# Altium footprint library common.PcbLib: 552 footprints (part 22 of 35)
Each footprint in its own frame and in the unit in brackets; x right, y up, seen from the top. Pads: shape width x height; smd on the part's side, far side on the other; paste and mask are expansions set on the pad; w line width, h text height; cw(c..) or ccw(c..) is an arc to the next point about the centre after c.
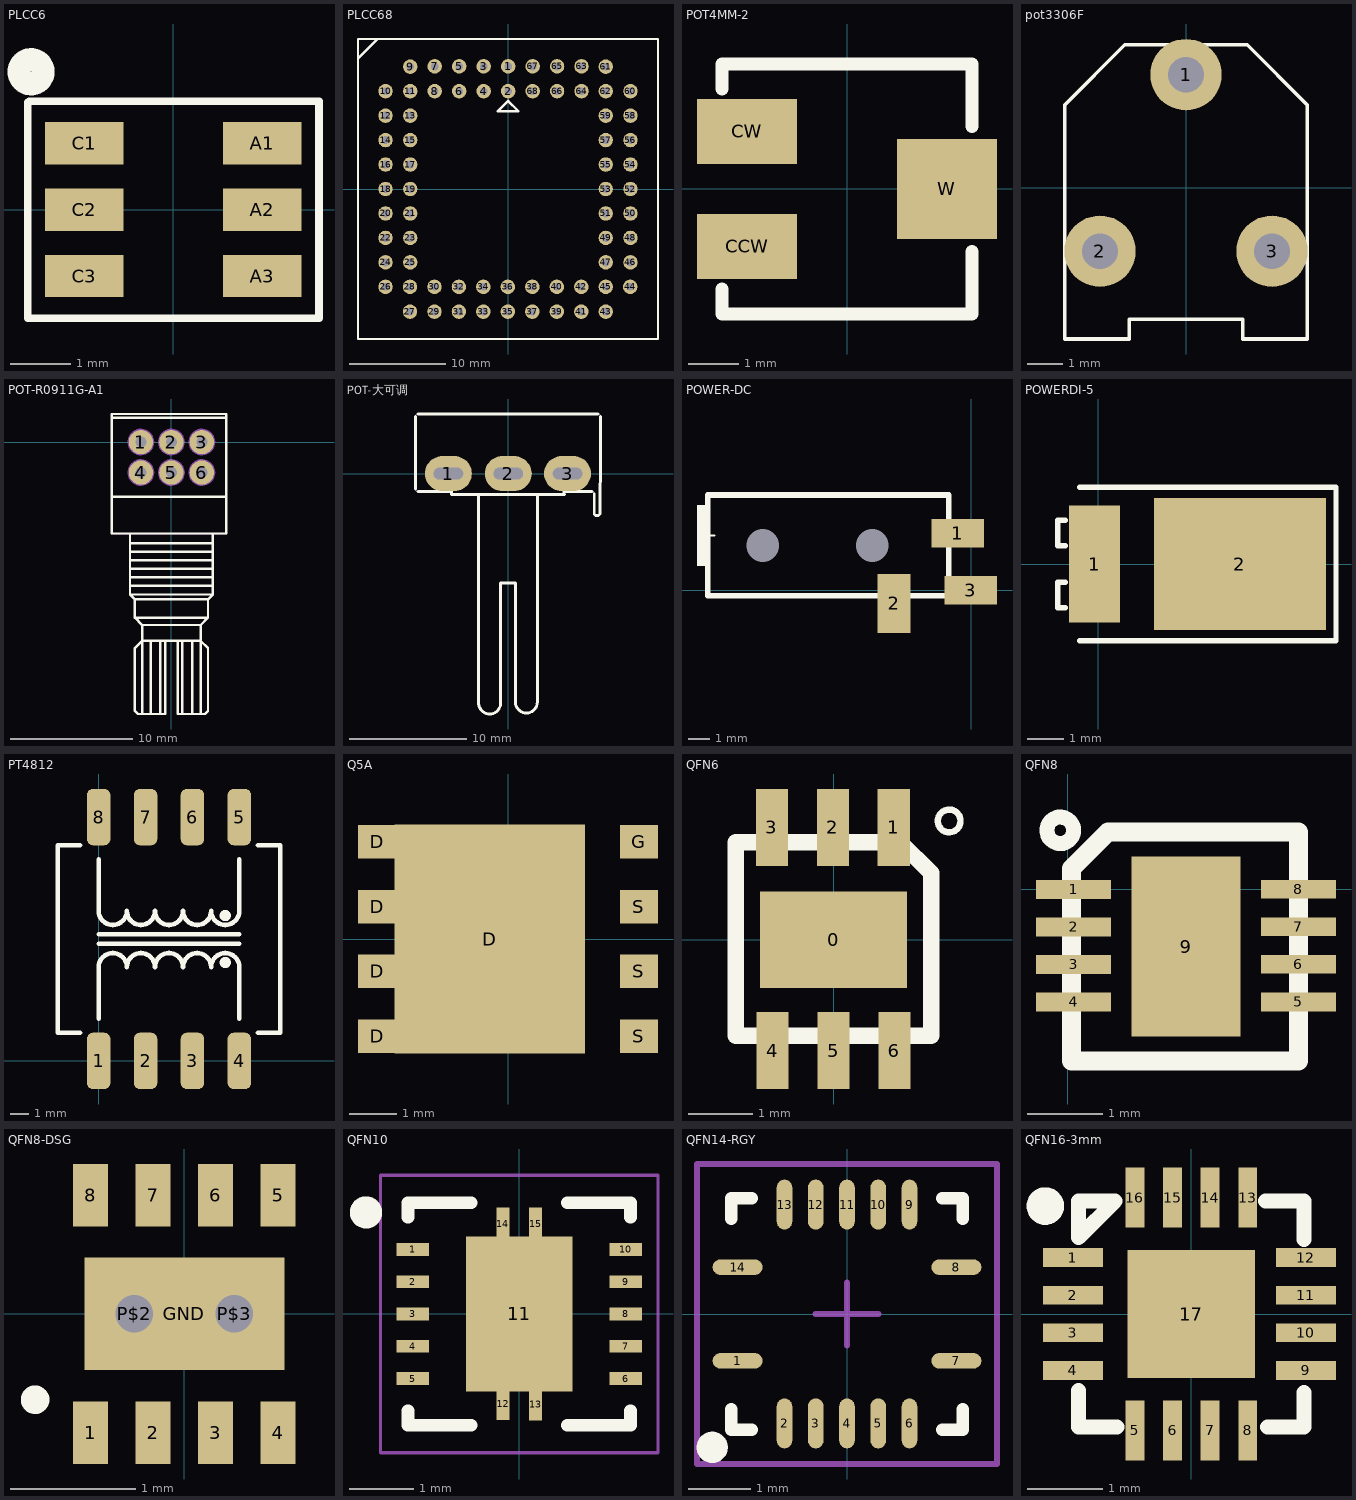
[diagram p21: the footprints below, top view; thin cyan lines are the x and y axes]

## PLCC6 [mm]
pads (6):
  rect 1.3x0.7 smd: A1(1.475,1.1) A2(1.475,0) A3(1.475,-1.1) C1(-1.475,1.1) C2(-1.475,0) C3(-1.475,-1.1)
Top Overlay:
  circle w0.381: c-2.359,2.286 r0.2
  lines w0.127: -2.413,-1.8 2.413,-1.8 2.413,1.8 -2.391,1.8 -2.413,1.778 -2.413,-1.8
3D body: height 2.01, standoff 0, extent -1.8,-1.85 1.8,1.65

## PLCC68 [mm]
pads (68):
  round 1.5 hole 0.8: 1(0.013,12.725) 2(0.013,10.16) 3(-2.527,12.725) 4(-2.527,10.16) 5(-5.067,12.725) 6(-5.067,10.16) 7(-7.607,12.725) 8(-7.607,10.16) 9(-10.147,12.7) 10(-12.713,10.16) 11(-10.147,10.16) 12(-12.713,7.62) 13(-10.147,7.62) 14(-12.713,5.08) 15(-10.147,5.08) 16(-12.713,2.54) 17(-10.147,2.54) 18(-12.713,0) 19(-10.147,0) 20(-12.713,-2.54) 21(-10.147,-2.54) 22(-12.713,-5.08) 23(-10.147,-5.08) 24(-12.713,-7.62) 25(-10.147,-7.62) 26(-12.713,-10.16) 27(-10.173,-12.725) 28(-10.173,-10.16) 29(-7.633,-12.725) 30(-7.633,-10.16) 31(-5.093,-12.725) 32(-5.093,-10.16) 33(-2.553,-12.725) 34(-2.553,-10.16) 35(-0.013,-12.725) 36(-0.013,-10.16) 37(2.527,-12.725) 38(2.527,-10.16) 39(5.067,-12.725) 40(5.067,-10.16) 41(7.607,-12.725) 42(7.607,-10.16) 43(10.147,-12.725) 44(12.687,-10.16) 45(10.147,-10.16) 46(12.713,-7.62) 47(10.147,-7.62) 48(12.713,-5.08) 49(10.147,-5.08) 50(12.713,-2.54) 51(10.147,-2.54) 52(12.713,0) 53(10.147,0) 54(12.713,2.54) 55(10.147,2.54) 56(12.713,5.08) 57(10.147,5.08) 58(12.713,7.62) 59(10.147,7.62) 60(12.713,10.16) 61(10.147,12.7) 62(10.147,10.16) 63(7.633,12.725) 64(7.633,10.16) 65(5.093,12.725) 66(5.093,10.16) 67(2.553,12.725) 68(2.553,10.16)
Top Overlay:
  lines w0.254: -15.57,13.564 -13.564,15.57 ; -15.57,-15.57 15.57,-15.57 15.57,15.57 -15.57,15.57 -15.57,-15.57 ; -1.041,8.09 1.067,8.09 0.013,9.144 -1.041,8.09
3D body: height 7.7, standoff -3.6, extent -15.387,-15.545 15.413,15.255

## POT4MM-2 [mm] "Square Trimming Potentiometer"
pads (3):
  rect 2x1.3 smd: CCW(-2,-1.15) CW(-2,1.15)
  rect 2x2 smd: W(2,0)
Top Overlay:
  lines w0.254: -2.5,-2 -2.5,-2.5 2.5,-2.5 2.5,-1.25 ; -2.5,2 -2.5,2.5 2.5,2.5 2.5,1.25
3D body: height 5.5, standoff 0, extent -2.489,-2.438 2.511,2.562

## pot3306F [mm]
pads (3):
  round 2 hole 1: 1(0,3.175) 2(-2.413,-1.778) 3(2.413,-1.778)
Top Overlay:
  lines w0.1: -2.611,-4.241 -1.595,-4.241 ; -2.964,-1.533 -2.964,-2.07 -3.405,-2.07 -3.405,-1.533 -2.964,-1.533 ; -2.964,-1.533 -2.084,-1.533 -2.084,-2.076 ; -2.964,-1.533 -2.964,-2.076 -2.084,-2.076 ; -2.084,-2.076 -2.084,-1.535 -1.595,-1.535 -1.595,-2.076 -2.084,-2.076 ; -1.595,-4.241 -3.405,-4.241 -3.405,-3.681 -3.405,-3.049 -3.405,2.323 -1.719,4.01 1.719,4.01 3.405,2.323 3.405,-3.681 3.405,-4.241 1.595,-4.241 1.595,-3.681 -1.595,-3.681 -1.595,-4.241 ; -0.464,3.474 -0.464,2.938 -0.905,2.938 -0.905,3.474 -0.464,3.474 ; -0.464,3.474 0.416,3.474 0.416,2.94 ; -0.464,3.474 -0.464,2.94 0.416,2.94 ; 0.416,2.94 0.416,3.479 0.905,3.479 0.905,2.94 0.416,2.94 ; 2.036,-1.533 2.036,-2.07 1.595,-2.07 1.595,-1.533 2.036,-1.533 ; 2.036,-1.533 2.916,-1.533 2.916,-2.076 ; 2.036,-1.533 2.036,-2.076 2.916,-2.076 ; 2.916,-2.076 2.916,-1.535 3.405,-1.535 3.405,-2.076 2.916,-2.076
3D body: height 7.62, standoff -3.04, extent -3.302,-4.191 3.508,4.061

## POT-R0911G-A1 [mm]
height 11.3
pads (6):
  round 2 hole 0.9: 1(-2.5,0) 2(0,0) 3(2.5,0) 4(-2.5,-2.5) 5(0,-2.5) 6(2.5,-2.5)
Top Overlay:
  lines w0.2: -4.9,-4.5 4.5,-4.5 ; -4.9,2 4.5,2 ; -3.4,-11.8 3.4,-11.8 3.4,-12.5 ; -3.4,-11.1 3.4,-11.1 ; -3.4,-10.4 3.4,-10.4 ; -3.4,-9.7 3.4,-9.7 ; -3.4,-9 3.4,-9 ; -3.4,-8.3 3.4,-8.3 ; -3.4,-7.5 -3.4,-12.5 ; -2.4,-22.3 -2.4,-16.3 ; -1.7,-22.3 -1.7,-16.3 ; -0.9,-22.3 -0.9,-16.3 ; -0.5,-16.3 -0.5,-22.3 -2.75,-22.3 -3,-22.05 -3,-16.9 -2.4,-16.3 ; 0.5,-16.3 0.5,-22.3 2.75,-22.3 3,-22.05 3,-16.9 2.4,-16.3 ; 0.9,-22.3 0.9,-16.3 ; 1.7,-22.3 1.7,-16.3 ; 2.4,-22.3 2.4,-16.3 ; 3.4,-7.5 3.4,-12.5 ; -3.4,-12.5 0,-12.5 3.4,-12.5 ; -3.4,-12.5 -3,-12.9 ; -3,-14.4 0,-14.4 3,-14.4 ; -3,-14.4 -3,-12.9 ; -3,-14.4 -2.4,-15 ; -3,-12.9 0,-12.9 3,-12.9 ; -2.4,-16.3 0,-16.3 2.4,-16.3 ; -2.4,-16.3 -2.4,-15 ; -2.4,-15 0,-15 2.4,-15 ; 2.4,-16.3 2.4,-15 ; 2.4,-15 3,-14.4 ; 3,-14.4 3,-12.9 ; 3,-12.9 3.4,-12.5 ; -4.9,-7.5 -4.9,2.3 4.5,2.3 4.5,-7.5 -4.9,-7.5
Mechanical 7:
  circle w0.2: c2.5,-2.5 r1
  circle w0.2: c0,-2.5 r1
  circle w0.2: c-2.5,-2.5 r1
  circle w0.2: c2.5,0 r1
  circle w0.2: c0,0 r1
  circle w0.2: c-2.5,0 r1
  lines w0.1: -4.9,-4.5 4.5,-4.5 ; -4.9,2 4.5,2 ; -3.4,-11.8 3.4,-11.8 3.4,-12.5 ; -3.4,-11.1 3.4,-11.1 ; -3.4,-10.4 3.4,-10.4 ; -3.4,-9.7 3.4,-9.7 ; -3.4,-9 3.4,-9 ; -3.4,-8.3 3.4,-8.3 ; -3.4,-7.5 -3.4,-12.5 ; -2.4,-22.3 -2.4,-16.3 ; -1.7,-22.3 -1.7,-16.3 ; -0.9,-22.3 -0.9,-16.3 ; -0.5,-16.3 -0.5,-22.3 -2.75,-22.3 -3,-22.05 -3,-16.9 -2.4,-16.3 ; 0.5,-16.3 0.5,-22.3 2.75,-22.3 3,-22.05 3,-16.9 2.4,-16.3 ; 0.9,-22.3 0.9,-16.3 ; 1.7,-22.3 1.7,-16.3 ; 2.4,-22.3 2.4,-16.3 ; 3.4,-7.5 3.4,-12.5 ; -3.4,-12.5 -3,-12.9 ; -3.4,-12.5 0,-12.5 3.4,-12.5 ; -3,-14.4 -2.4,-15 ; -3,-14.4 -3,-12.9 ; -3,-14.4 0,-14.4 3,-14.4 ; -3,-12.9 0,-12.9 3,-12.9 ; -2.4,-16.3 -2.4,-15 ; -2.4,-16.3 0,-16.3 2.4,-16.3 ; -2.4,-15 0,-15 2.4,-15 ; 2.4,-16.3 2.4,-15 ; 2.4,-15 3,-14.4 ; 3,-14.4 3,-12.9 ; 3,-12.9 3.4,-12.5 ; -4.9,-7.5 4.5,-7.5 4.5,2.3 -4.9,2.3 -4.9,-7.5
3D body: height 12.64, standoff -2.5, extent -5.73,-27.97 5.768,1.504

## POT-大可调 [mm]
pads (3):
  oval 4x3 hole 1 slot 2.5 at 0 deg: 1(-5.104,0) 2(0,0) 3(5.05,0)
Top Overlay:
  lines w0.254: -7.899,-1.324 -7.899,0 -7.899,4.88 ; -7.699,-1.524 -7.524,-1.524 -6.342,-1.524 -4.979,-1.524 -4.829,-1.524 -4.829,-1.778 4.778,-1.778 ; -7.699,5.08 -6.883,5.08 6.757,5.08 7.649,5.08 ; -0.724,-0.25 0.673,-0.25 0.673,0.25 -0.724,0.25 -0.724,-0.228 ; 4.74,-1.778 4.74,-1.524 7.122,-1.524 ; 7.322,-3.429 7.322,-1.724 ; 7.449,-3.556 7.702,-3.556 ; 7.829,-3.429 7.829,-1.524 7.849,0 7.849,3.048 7.849,4.88 ; -5.804,-0.25 -4.407,-0.25 -4.407,0.25 -5.804,0.25 -5.804,-0.25 ; -2.521,-19.462 ccw(c-1.59,-19.544) -0.66,-19.462 -0.66,-9.302 0.61,-9.302 0.61,-19.462 ccw(c1.543,-19.462) 2.477,-19.462 2.477,-9.302 2.477,-1.778 -2.521,-1.778 -2.521,-9.302 -2.521,-19.462 ; 4.356,-0.25 5.753,-0.25 5.753,0.25 4.356,0.25 4.356,-0.25
Mechanical 6:
  lines w0.1: -7.899,-1.324 ccw(c-7.699,-1.324) -7.699,-1.524 ; -7.899,4.88 cw(c-7.699,4.88) -7.699,5.08 ; 7.122,-1.524 cw(c7.122,-1.724) 7.322,-1.724 ; 7.649,5.08 cw(c7.649,4.88) 7.849,4.88
3D body: height 20.62, standoff -4, extent -7.849,-20.433 7.899,5.135

## POWER-DC [mm]
pads (5):
  round 0 hole 1.5 mask+0: 0(-9.521,2.057) 0(-4.521,2.057)
  rect 2.4x1.3 smd: 1(-0.621,2.607) 3(-0.021,0.007)
  rect 1.5x2.7 smd: 2(-3.521,-0.593)
Top Overlay:
  rectangle: -12.521,1.107 -11.921,3.907
  lines w0.1: -12.221,2.507 -11.721,2.507
  lines w0.254: -12.021,-0.243 -12.021,4.357 -1.021,4.357 -1.021,-0.243 -12.021,-0.243
3D body: height 4.4, standoff -0.8, extent -11.996,-1.818 0.604,4.482

## POWERDI-5 [mm]
pads (2):
  rect 1.4x3.2 smd: 1(-0.1,0)
  rect 4.7x3.6 smd: 2(3.87,0)
Top Overlay:
  lines w0.15: -0.9,-1.2 -1.1,-1.2 -1.1,-0.5 -0.9,-0.5 ; -0.9,0.5 -1.1,0.5 -1.1,1.2 -0.9,1.2 ; -0.5,-2.1 6.5,-2.1 6.5,2.1 -0.5,2.1
3D body: height 1.17, standoff 0.02, extent -0.5,-2.025 6.1,2.025

## PT4812 [mm] "Transformer for Digital Audio Data Transmission"
height 9.15
pads (8):
  rrect50% 1.27x3.05 smd: 1(0,0) 2(2.54,0) 3(5.08,0) 4(7.62,0) 5(7.62,13.21) 6(5.08,13.21) 7(2.54,13.21) 8(0,13.21)
Top Overlay:
  circle w0.254: c6.858,7.874 r0.18
  circle w0.254: c6.858,5.334 r0.18
  lines w0.254: -1.016,1.524 -2.22,1.524 -2.22,11.686 -1.016,11.686 ; 0,2.286 0,5.08 cw(c0.762,5.08) 0.762,5.842 cw(c0.762,5.08) 1.524,5.08 cw(c2.286,5.08) 2.286,5.842 cw(c2.286,5.08) 3.048,5.08 cw(c3.81,5.08) 3.81,5.842 cw(c3.81,5.08) 4.572,5.08 cw(c5.334,5.08) 5.334,5.842 cw(c5.334,5.08) 6.096,5.08 cw(c6.858,5.08) 6.858,5.842 cw(c6.858,5.08) 7.62,5.08 7.62,2.286 ; 0,6.35 7.62,6.35 ; 0,6.858 7.62,6.858 0.508,6.858 ; 0,10.922 0,8.128 ccw(c0.762,8.128) 0.762,7.366 ccw(c0.762,8.128) 1.524,8.128 ccw(c2.286,8.128) 2.286,7.366 ccw(c2.286,8.128) 3.048,8.128 ccw(c3.81,8.128) 3.81,7.366 ccw(c3.81,8.128) 4.572,8.128 ccw(c5.334,8.128) 5.334,7.366 ccw(c5.334,8.128) 6.096,8.128 ccw(c6.858,8.128) 6.858,7.366 ccw(c6.858,8.128) 7.62,8.128 7.62,10.922 ; 6.731,5.334 7.038,5.334 ; 6.731,7.874 7.038,7.874 ; 8.636,1.524 9.84,1.524 9.84,11.686 8.636,11.686
3D body: height 8.86, standoff 0.02, extent -2.281,-0.289 9.779,13.243

## Q5A [mm] "TI PACKAGE"
pads (9):
  rect 0.8x0.7 smd: D(-2.75,-2.04) D(-2.75,-0.68) D(-2.75,0.68) D(-2.75,2.04) G(2.75,2.04) S(2.75,-2.04) S(2.75,-0.68) S(2.75,0.68)
  rect 4x4.8 smd: D(-0.381,0)
3D body: height 1, standoff 0, extent -3.003,-2.438 2.997,2.462

## QFN6 [mm] "SOT-23/SC-74A; 5 Leads; Body 3.1 x 3 mm, inc. leads (LxW max)"
height 1.45
pads (7):
  rect 2.3x1.5 smd: 0(0,0)
  rect 0.5x1.2 smd: 1(0.94,1.753) 2(-0.01,1.753) 3(-0.96,1.753) 4(-0.95,-1.727) 5(0,-1.727) 6(0.95,-1.727)
Top Overlay:
  circle w0.1: c1.804,1.854 r0.177
  lines w0.254: -1.524,-1.499 1.524,-1.499 1.524,1.041 1.041,1.524 -1.524,1.524 -1.524,-1.499
3D body: height 1, standoff 0, extent -1.524,-1.499 1.524,1.524

## QFN8 [mm] "SOT-23/SC-74A; 5 Leads; Body 3.1 x 3 mm, inc. leads (LxW max)"
height 1.45
pads (9):
  rect 1x0.25 smd: 1(0.076,0) 2(0.076,-0.5) 3(0.076,-1) 5(3.073,-1.499) 6(3.073,-0.999) 7(3.073,-0.499) 8(3.073,0.001)
  rect 1x0.25 smd paste+0: 4(0.076,-1.5)
  rect 1.45x2.4 smd: 9(1.575,-0.762)
Top Overlay:
  circle w0.2: c-0.101,0.787 r0.177
  lines w0.254: 0.051,-2.286 3.073,-2.286 3.073,0.762 0.533,0.762 0.051,0.279 0.051,-2.286
3D body: height 1, standoff 0, extent 0.051,-2.286 3.073,0.762

## QFN8-DSG [mm]
pads (11):
  rect 0.28x0.5 smd: 1(-0.75,-0.95) 2(-0.25,-0.95) 3(0.25,-0.95) 4(0.75,-0.95) 5(0.75,0.95) 6(0.25,0.95) 7(-0.25,0.95) 8(-0.75,0.95)
  rect 1.6x0.9 smd: GND(0,0)
  rect 0.55x0.55 hole 0.3: P$2(-0.4,0) P$3(0.4,0)
Top Overlay:
  circle w0.127: c-1.194,-0.686 r0.051
3D body: height 0.76, standoff -0.04, extent -1.05,-1.041 1.05,1.059

## QFN10 [mm] "QFN, 14-Leads, Body 3.00x3.00mm, Pitch 0.50mm, Thermal Pad 1.63x2.40mm, IPC Medium Density"
height 1
pads (15):
  rect 0.5x0.2 smd: 1(-1.65,1) 2(-1.65,0.5) 3(-1.65,0) 4(-1.65,-0.5) 5(-1.65,-1) 6(1.65,-1) 7(1.65,-0.5) 8(1.65,0) 9(1.65,0.5) 10(1.65,1)
  rect 1.65x2.4 smd: 11(0,0)
  rect 0.2x0.5 smd: 12(-0.25,-1.392) 13(0.254,-1.397) 14(-0.254,1.397) 15(0.254,1.397)
Top Overlay:
  circle w0.25: c-2.375,1.575 r0.125
  lines w0.2: -1.725,-1.5 -1.725,-1.725 -0.75,-1.725 ; -1.725,1.5 -1.725,1.725 -0.75,1.725 ; 0.75,-1.725 1.725,-1.725 1.725,-1.5 ; 0.75,1.725 1.725,1.725 1.725,1.5
Mechanical 15:
  lines w0.05: -2.15,-2.15 -2.15,2.15 2.15,2.15 2.15,-2.15 -2.15,-2.15
  lines w0.1: -0.5,0 0.5,0 ; 0,-0.5 0,0.5
3D body: height 0.2, standoff 0.05, extent -1.6,-1.092 -1.397,-0.914
3D body: height 0.2, standoff 0.05, extent -1.6,-0.584 -1.397,-0.406
3D body: height 0.2, standoff 0.05, extent -1.6,-0.102 -1.397,0.076
3D body: height 0.2, standoff 0.05, extent -1.6,0.406 -1.397,0.584
3D body: height 0.2, standoff 0.05, extent -1.6,0.914 -1.397,1.092
3D body: height 0.2, standoff 0.05, extent 1.397,0.914 1.6,1.092
3D body: height 0.2, standoff 0.05, extent 1.397,0.406 1.6,0.584
3D body: height 0.2, standoff 0.05, extent 1.397,-0.076 1.6,0.102
3D body: height 0.2, standoff 0.05, extent 1.397,-0.584 1.6,-0.406
3D body: height 0.2, standoff 0.05, extent 1.397,-1.092 1.6,-0.914
3D body: height 0.2, standoff 0.05, extent -0.356,1.397 -0.178,1.6
3D body: height 0.2, standoff 0.05, extent 0.152,1.397 0.33,1.6
3D body: height 0.2, standoff 0.05, extent -0.343,-1.6 -0.165,-1.397
3D body: height 0.2, standoff 0.05, extent 0.152,-1.6 0.33,-1.397
3D body: height 1, standoff 0.05, extent -1.575,-1.575 1.575,1.575

## QFN14-RGY [mm] "QFN14-RGY (LIB+=TXS0104E)"
height 1
pads (14):
  oval 0.8x0.25 smd: 1(-1.75,-0.75) 7(1.75,-0.75) 8(1.75,0.75) 14(-1.75,0.75)
  oval 0.25x0.8 smd: 2(-1,-1.75) 3(-0.5,-1.75) 4(0,-1.75) 5(0.5,-1.75) 6(1,-1.75) 9(1,1.75) 10(0.5,1.75) 11(0,1.75) 12(-0.5,1.75) 13(-1,1.75)
Top Overlay:
  circle w0.25: c-2.157,-2.134 r0.125
  lines w0.2: -1.85,-1.525 -1.85,-1.85 -1.525,-1.85 ; -1.85,1.525 -1.85,1.85 -1.525,1.85 ; 1.525,-1.85 1.85,-1.85 1.85,-1.525 ; 1.525,1.85 1.85,1.85 1.85,1.525
Mechanical 15:
  lines w0.1: -0.5,0 0.5,0 ; 0,-0.5 0,0.5 ; -2.4,-2.4 2.4,-2.4 2.4,2.4 -2.4,2.4 -2.4,-2.4
3D body: height 1, standoff 0, extent -1.753,-1.753 1.747,1.747

## QFN16-3mm [mm] "QFN, 16-Leads, Body 3.0x3.0mm (max), Pitch 0.50mm, IPC Low Density"
height 3
pads (17):
  rect 0.8x0.25 smd: 1(-1.575,0.75) 2(-1.575,0.25) 3(-1.575,-0.25) 4(-1.575,-0.75) 9(1.524,-0.75) 10(1.524,-0.25) 11(1.524,0.25) 12(1.524,0.75)
  rect 0.25x0.8 smd: 5(-0.75,-1.55) 6(-0.25,-1.55) 7(0.25,-1.55) 8(0.75,-1.55) 13(0.75,1.55) 14(0.25,1.55) 15(-0.25,1.55) 16(-0.75,1.55)
  rect 1.7x1.7 smd: 17(0,0)
Top Overlay:
  circle w0.25: c-1.941,1.436 r0.125
  lines w0.2: -1.5,-1.015 -1.5,-1.5 -0.989,-1.5 ; 0.989,1.5 1.5,1.5 1.5,0.989 ; 1.016,-1.5 1.5,-1.5 1.5,-1.041 ; -1.5,1.016 -1.5,1.5 -1.016,1.5 -1.5,1.016
3D body: height 0.9, standoff 0, extent -1.549,-1.521 1.493,1.521